# Altium footprint library ALL.PcbLib: 385 footprints (part 24 of 25)
Each footprint in its own frame and in the unit in brackets; x right, y up, seen from the top. Pads: shape width x height; smd on the part's side, far side on the other; paste and mask are expansions set on the pad; w line width, h text height; cw(c..) or ccw(c..) is an arc to the next point about the centre after c.
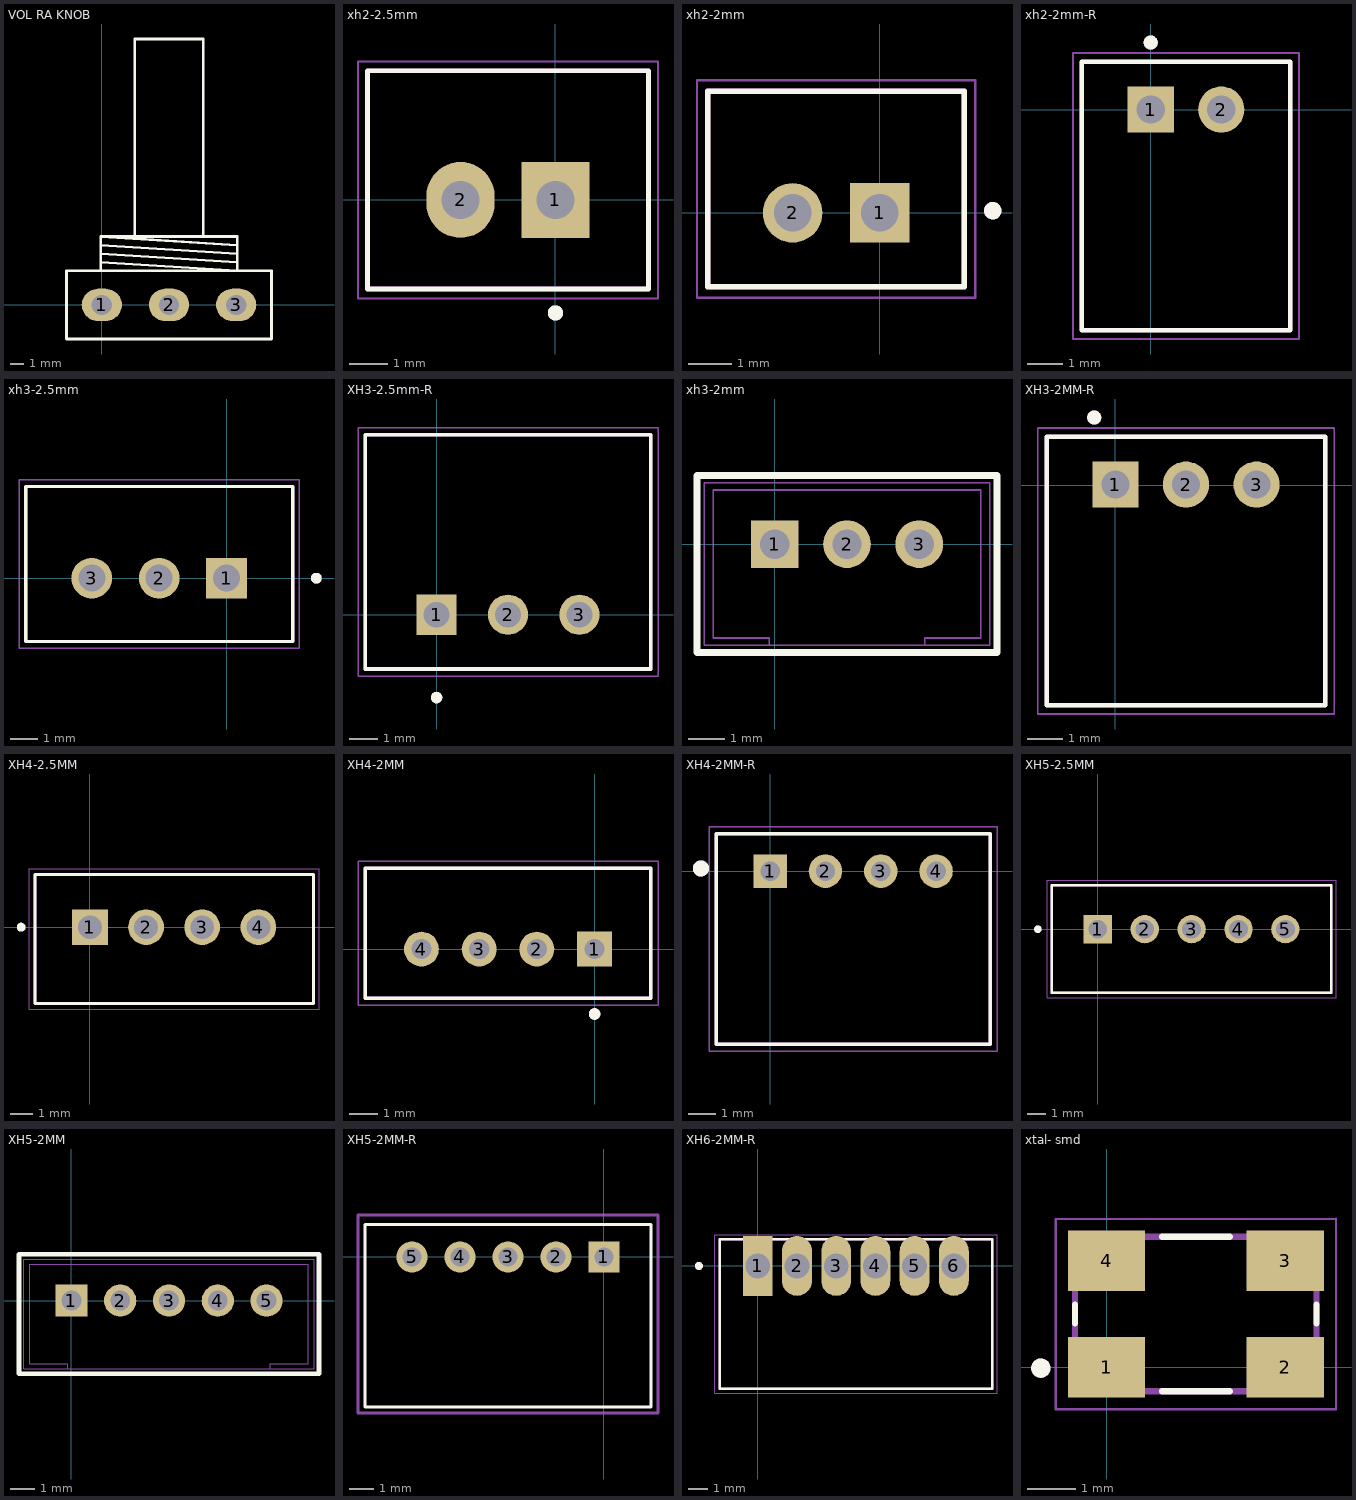
[diagram p23: the footprints below, top view; thin cyan lines are the x and y axes]

## VOL RA KNOB [mm]
pads (3):
  oval 3x2.4 hole 1.5: 1(0,0) 2(5,0) 3(10,0)
Top Overlay:
  lines w0.2: -0.08,2.54 -0.08,5.08 ; -0.08,3.175 10.08,2.54 10.08,5.08 -0.08,5.08 ; -0.08,3.81 10.08,3.175 ; -0.08,4.445 10.08,3.81 ; 2.46,5.08 2.46,19.781 7.54,19.781 7.54,5.08 ; 10.08,4.445 -0.08,5.08 ; -2.62,-2.54 12.62,-2.54 12.62,2.54 -2.62,2.54 -2.62,-2.54
3D body "volome cover2.STEP": height 24.54, standoff 2.14, extent -5.761,7.8 15.932,27.8
3D body "SW3dPS-Pot.STEP": height 20.64, standoff -4, extent -2.947,-4.998 12.801,20.56

## xh2-2.5mm [mm]
pads (2):
  rect 1.8x2 hole 1: 1(0,0)
  oval 1.8x2 hole 1: 2(-2.5,0)
Top Overlay:
  circle w0.2: c0,-2.975 r0.1
  lines w0.127: -4.95,-2.35 -4.95,3.4 2.45,3.4 2.45,-2.35 -4.95,-2.35
Mechanical 13:
  circle w0.2: c0,-2.975 r0.1
  lines w0.127: -4.95,-2.35 -4.95,3.4 2.45,3.4 2.45,-2.35 -4.95,-2.35
Mechanical 15:
  lines w0.05: -5.2,-2.6 -5.2,3.65 2.7,3.65 2.7,-2.6 -5.2,-2.6
3D body "step_temp.STEP": height 7, standoff -3.4, extent -4.95,-2.35 2.45,3.4

## xh2-2mm [mm]
pads (2):
  rect 1.368x1.368 hole 0.86: 1(0,0)
  round 1.368 hole 0.86: 2(-2,0)
Top Overlay:
  circle w0.2: c2.6,0.05 r0.1
  lines w0.127: -3.95,-1.7 -3.95,2.8 1.95,2.8 1.95,-1.7 -3.95,-1.7
Mechanical 13:
  circle w0.2: c2.6,0.05 r0.1
  lines w0.127: -3.95,-1.7 1.95,-1.7 1.95,2.8 -3.95,2.8 -3.95,-1.7
Mechanical 15:
  lines w0.05: -4.2,-1.95 2.2,-1.95 2.2,3.05 -4.2,3.05 -4.2,-1.95
3D body "B2B-PH-K-S(LF)(SN)--3DModel-STEP-56544.STEP": height 3, standoff -6.4, extent -3.95,-1.736 1.95,2.764

## xh2-2mm-R [mm]
pads (2):
  rect 1.308x1.308 hole 0.8: 1(0,0)
  round 1.308 hole 0.8: 2(2,0)
Top Overlay:
  circle w0.2: c0,1.9 r0.1
  lines w0.127: -1.95,-6.25 3.95,-6.25 3.95,1.35 -1.95,1.35 -1.95,-6.25
Mechanical 13:
  circle w0.2: c0,1.9 r0.1
  lines w0.127: -1.95,-6.25 3.95,-6.25 3.95,1.35 -1.95,1.35 -1.95,-6.25
Mechanical 15:
  lines w0.05: -2.2,-6.5 4.2,-6.5 4.2,1.6 -2.2,1.6 -2.2,-6.5
3D body "S2B-PH-K-S(LF)(SN)--3DModel-STEP-1 (1).STEP": height 4.8, standoff -3.38, extent -1.921,-6.213 3.979,1.387

## xh3-2.5mm [mm]
pads (3):
  rect 1.508x1.508 hole 1: 1(0,0)
  round 1.508 hole 1: 2(-2.5,0) 3(-5,0)
Top Overlay:
  circle w0.2: c3.33,0 r0.1
  lines w0.127: -7.45,-2.35 2.45,-2.35 2.45,3.4 -7.45,3.4 -7.45,-2.35
Mechanical 13:
  circle w0.2: c3.33,0 r0.1
  lines w0.127: -7.45,-2.35 -7.45,3.4 2.45,3.4 2.45,-2.35 -7.45,-2.35
Mechanical 15:
  lines w0.05: -7.7,-2.6 -7.7,3.65 2.7,3.65 2.7,-2.6 -7.7,-2.6
3D body "step_temp.STEP": height 7, standoff -3.4, extent -7.45,-2.35 2.45,3.4

## XH3-2.5mm-R [mm]
pads (3):
  rect 1.408x1.408 hole 0.9: 1(0,0)
  round 1.408 hole 0.9: 2(2.5,0) 3(5,0)
Top Overlay:
  circle w0.2: c0,-2.9 r0.1
  lines w0.127: -2.5,-1.9 -2.5,6.3 7.5,6.3 7.5,-1.9 -2.5,-1.9
Mechanical 13:
  circle w0.2: c0,-2.9 r0.1
  lines w0.127: -2.5,-1.9 -2.5,6.3 7.5,6.3 7.5,-1.9 -2.5,-1.9
Mechanical 15:
  lines w0.05: -2.75,-2.15 7.75,-2.15 7.75,6.55 -2.75,6.55 -2.75,-2.15
3D body "440053-3.stp": height 3.8, standoff -3.8, extent -2.5,-1.9 7.5,6.3

## xh3-2mm [mil]
pads (3):
  rect 52x52 hole 32: 1(0,0)
  round 52 hole 32: 2(78.74,0) 3(157.48,0)
Top Overlay:
  lines w8: -84.65,-118.11 242.13,-118.11 242.13,74.8 -84.65,74.8 -84.65,-118.11
Mechanical 13:
  lines w2: -5.91,-110.24 163.39,-110.24 ; -5.91,-110.24 -76.77,-110.24 -76.77,66.93 234.25,66.93 234.25,-110.24 163.39,-110.24 ; -5.91,-110.24 -5.91,-102.36 -66.93,-102.36 -66.93,59.06 224.41,59.06 224.41,-102.36 163.39,-102.36 163.39,-110.24
3D body "step_temp.STEP": height 236.22, standoff -133.86, extent -76.77,-110 234.25,67.17

## XH3-2MM-R [mm]
pads (3):
  rect 1.308x1.308 hole 0.8: 1(0,0.025)
  round 1.308 hole 0.8: 2(2,0.025) 3(4,0.025)
Top Overlay:
  circle w0.2: c-0.6,1.925 r0.1
  lines w0.127: -1.95,-6.225 5.95,-6.225 5.95,1.375 -1.95,1.375 -1.95,-6.225
Mechanical 13:
  circle w0.2: c-0.6,1.925 r0.1
  lines w0.127: -1.95,-6.225 5.95,-6.225 5.95,1.375 -1.95,1.375 -1.95,-6.225
Mechanical 15:
  lines w0.05: -2.2,-6.475 -2.2,1.625 6.2,1.625 6.2,-6.475 -2.2,-6.475
3D body "S3B-PH-K-S-LF--SN---3DModel-STEP-56544 (1).STEP": height 4.8, standoff -3.38, extent -1.931,-6.315 5.969,1.285

## XH4-2.5MM [mm]
pads (4):
  rect 1.59x1.59 hole 1.06: 1(0,0)
  round 1.59 hole 1.06: 2(2.5,0) 3(5,0) 4(7.5,0)
Top Overlay:
  circle w0.2: c-3.06,0 r0.1
  lines w0.127: -2.45,-3.4 -2.45,2.35 9.95,2.35 9.95,-3.4 -2.45,-3.4
Mechanical 13:
  lines w0.127: -2.45,-3.4 -2.45,2.35 9.95,2.35 9.95,-3.4 -2.45,-3.4
Mechanical 15:
  lines w0.05: -2.7,-3.65 -2.7,2.6 10.2,2.6 10.2,-3.65 -2.7,-3.65
3D body "step_temp.STEP": height 7, standoff -3.4, extent -2.45,-3.4 9.95,2.35

## XH4-2MM [mm]
pads (4):
  rect 1.208x1.208 hole 0.7: 1(0,0)
  round 1.208 hole 0.7: 2(-2,0) 3(-4,0) 4(-6,0)
Top Overlay:
  circle w0.2: c0,-2.25 r0.1
  lines w0.127: -7.95,-1.7 1.95,-1.7 1.95,2.8 -7.95,2.8 -7.95,-1.7
Mechanical 13:
  circle w0.2: c0,-2.25 r0.1
  lines w0.127: -7.95,-1.7 -7.95,2.8 1.95,2.8 1.95,-1.7 -7.95,-1.7
Mechanical 15:
  lines w0.05: -8.2,-1.95 -8.2,3.05 2.2,3.05 2.2,-1.95 -8.2,-1.95
3D body "B4B-PH-K-S(LF)(SN)--3DModel-STEP-56544.STEP": height 6.05, standoff -3.35, extent -7.947,-1.664 1.953,2.836

## XH4-2MM-R [mm]
pads (4):
  rect 1.208x1.208 hole 0.7: 1(0,0)
  round 1.208 hole 0.7: 2(2,0) 3(4,0) 4(6,0)
Top Overlay:
  circle w0.3: c-2.5,0.1 r0.141
  lines w0.127: -1.95,-6.25 7.95,-6.25 7.95,1.35 -1.95,1.35 -1.95,-6.25
Mechanical 13:
  circle w0.3: c-2.5,0.1 r0.141
  lines w0.127: -1.95,-6.25 -1.95,1.35 7.95,1.35 7.95,-6.25 -1.95,-6.25
Mechanical 15:
  lines w0.05: -2.2,-6.5 -2.2,1.6 8.2,1.6 8.2,-6.5 -2.2,-6.5
3D body "S4B-PH-K-S(LF)(SN)--3DModel-STEP-56544.STEP": height 4.8, standoff -3.38, extent -1.899,-6.213 8.001,1.387

## XH5-2.5MM [mm]
pads (5):
  rect 1.508x1.508 hole 1: 1(0,0)
  round 1.508 hole 1: 2(2.5,0) 3(5,0) 4(7.5,0) 5(10,0)
Top Overlay:
  circle w0.2: c-3.2,0 r0.1
  lines w0.127: -2.45,-3.4 -2.45,2.35 12.45,2.35 12.45,-3.4 -2.45,-3.4
Mechanical 13:
  circle w0.2: c-3.2,0 r0.1
  lines w0.127: -2.45,-3.4 -2.45,2.35 12.45,2.35 12.45,-3.4 -2.45,-3.4
Mechanical 15:
  lines w0.05: -2.7,-3.65 12.7,-3.65 12.7,2.6 -2.7,2.6 -2.7,-3.65
3D body "step_temp.STEP": height 7, standoff -3.4, extent -2.45,-3.302 12.45,2.448

## XH5-2MM [mil]
pads (5):
  rect 52x52 hole 32: 1(0,0)
  round 52 hole 32: 2(78.74,0) 3(157.48,0) 4(236.22,0) 5(314.96,0)
Top Overlay:
  lines w8: -84.65,-118.11 399.61,-118.11 399.61,74.8 -84.65,74.8 -84.65,-118.11
Mechanical 13:
  lines w2: -5.91,-110.24 320.87,-110.24 ; -5.91,-110.24 -76.77,-110.24 -76.77,66.93 391.73,66.93 391.73,-110.24 320.87,-110.24 ; -5.91,-110.24 -5.91,-102.36 -66.93,-102.36 -66.93,59.06 381.89,59.06 381.89,-102.36 320.87,-102.36 320.87,-110.24

## XH5-2MM-R [mm]
pads (5):
  rect 1.308x1.308 hole 0.8: 1(0,0)
  round 1.308 hole 0.8: 2(-2,0) 3(-4,0) 4(-6,0) 5(-8,0)
Top Overlay:
  lines w0.127: -9.95,-6.25 -9.95,1.35 1.95,1.35 1.95,-6.25 -9.95,-6.25
Mechanical 15:
  lines w0.127: -10.25,-6.5 2.25,-6.5 2.25,1.75 -10.25,1.75 -10.25,-6.5
3D body "S5B-PH-K-S(LF)(SN)--3DModel-STEP-56544.STEP": height 4.8, standoff -3.38, extent -9.931,-6.213 1.969,1.387

## XH6-2MM-R [mil]
pads (6):
  rect 60x120 hole 50: 1(0,0)
  oval 60x120 hole 50: 2(78.74,0) 3(157.48,0) 4(236.22,0) 5(314.96,0) 6(393.7,0)
Top Overlay:
  circle w7.87: c-118.11,0 r3.94
  lines w5: -76.77,-246.06 470.47,-246.06 470.47,53.15 -76.77,53.15 -76.77,-246.06
Mechanical 13:
  circle w7.87: c-118.11,0 r3.94
  lines w5: -76.77,-246.06 470.47,-246.06 470.47,53.15 -76.77,53.15 -76.77,-246.06
Mechanical 15:
  lines w1.97: -86.61,-255.91 -86.61,62.99 480.31,62.99 480.31,-255.91 -86.61,-255.91
3D body "S6B-PH-K-S-LF--SN---3DModel-STEP-56544.STEP": height 188.98, standoff -133.19, extent -78.62,-244.6 468.63,54.61

## xtal- smd [mm]
pads (4):
  rect 1.6x1.25 smd: 1(0,0) 2(3.7,0) 3(3.7,2.2) 4(0,2.2)
Top Overlay:
  circle w0.2: c-1.36,-0.02 r0.1
  lines w0.127: -0.65,0.9 -0.65,1.3 ; 1.15,-0.5 2.55,-0.5 ; 1.15,2.7 2.55,2.7 ; 4.35,0.9 4.35,1.3
Mechanical 13:
  circle w0.2: c-1.36,-0.02 r0.1
  lines w0.127: -0.65,-0.5 4.35,-0.5 4.35,2.7 -0.65,2.7 -0.65,-0.5
Mechanical 15:
  lines w0.05: -1.05,-0.875 4.75,-0.875 4.75,3.075 -1.05,3.06 -1.05,-0.875
3D body "ECS-100-8-30B-CKM-TR-TR.STEP": height 0.85, standoff 0, extent -0.65,-0.5 4.35,2.7